# Altium footprint library ThanhNT.PcbLib: 579 footprints (part 16 of 37)
Each footprint in its own frame and in the unit in brackets; x right, y up, seen from the top. Pads: shape width x height; smd on the part's side, far side on the other; paste and mask are expansions set on the pad; w line width, h text height; cw(c..) or ccw(c..) is an arc to the next point about the centre after c.
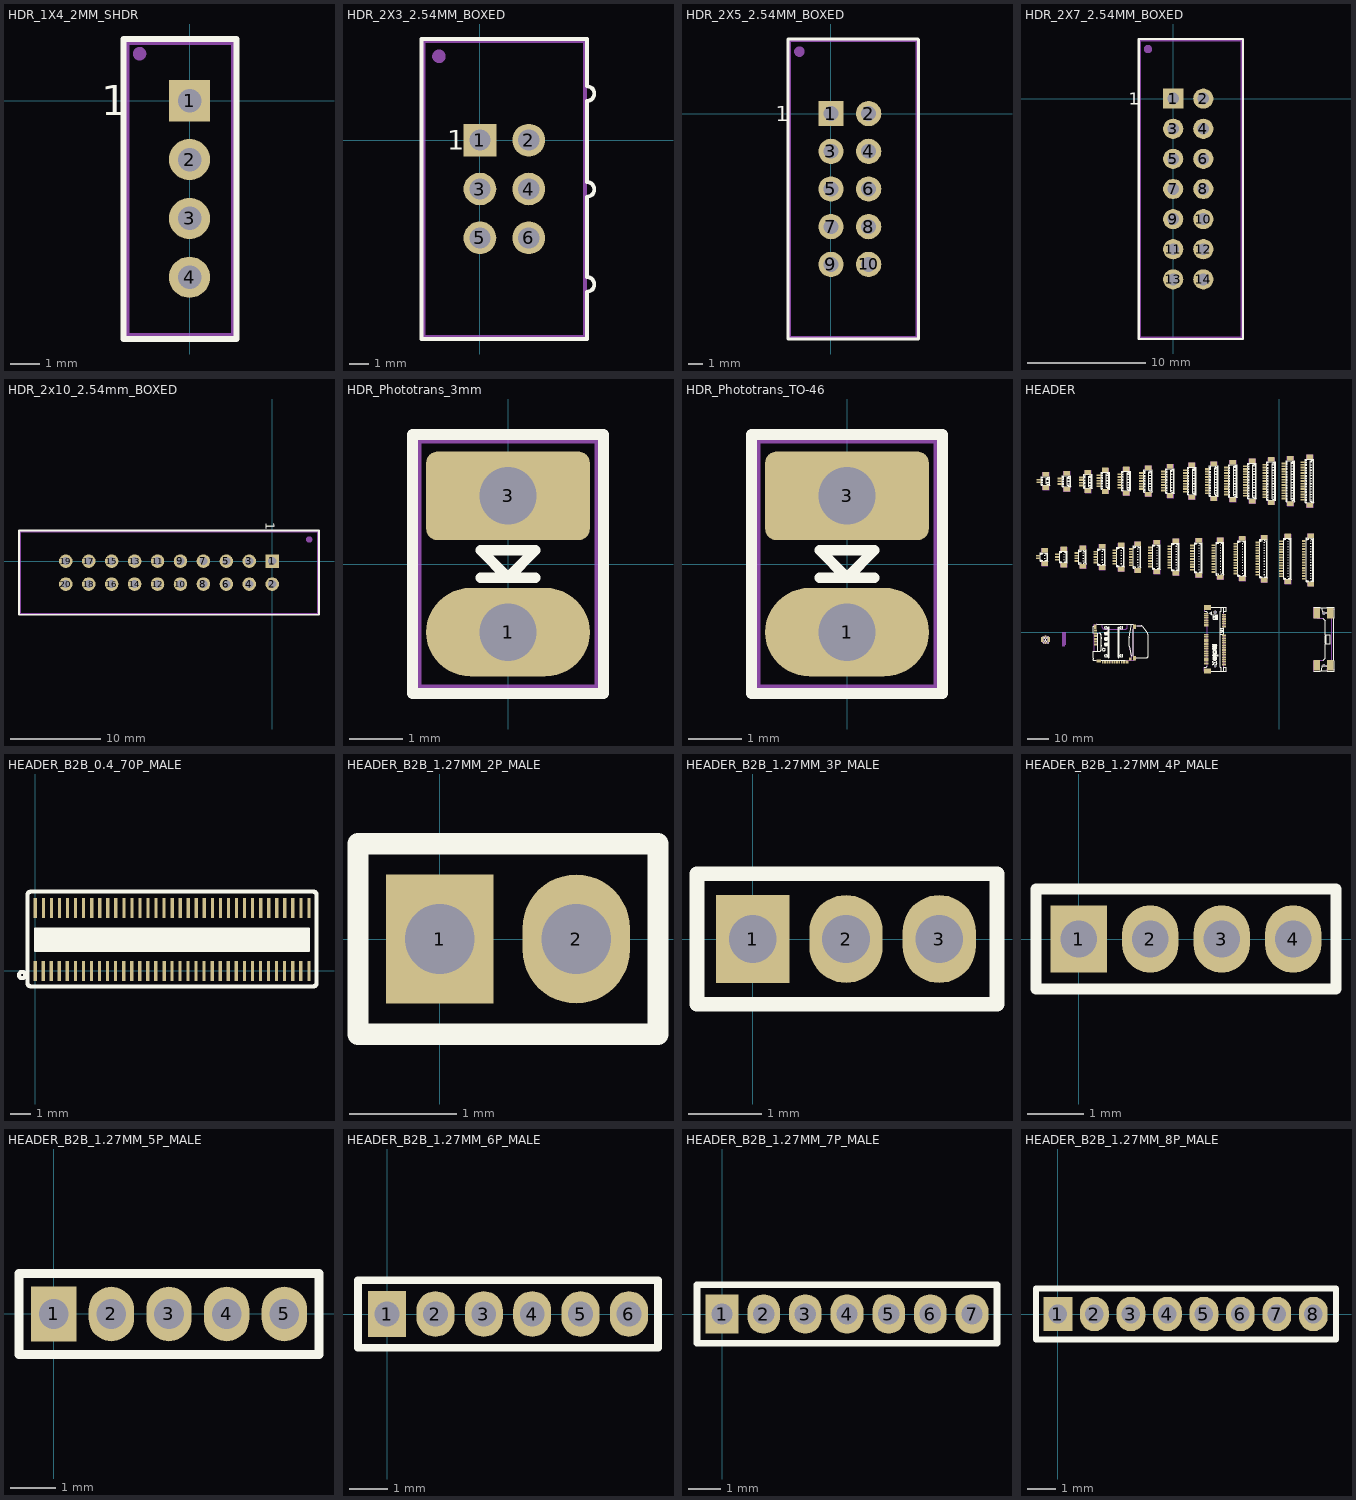
[diagram p15: the footprints below, top view; thin cyan lines are the x and y axes]

## HDR_1X4_2MM_SHDR [mm]
pads (4):
  rect 1.4x1.4 hole 0.8: 1(0,0)
  round 1.4 hole 0.8: 2(0,-2) 3(0,-4) 4(0,-6)
Top Overlay:
  lines w0.2: -2.25,-8.1 1.6,-8.1 1.6,2.1 -2.25,2.1 -2.25,-8.1
  text "1" at -3,-0.5 h1.02
Mechanical 16:
  circle w0.254: c-1.7,1.6 r0.1
  lines w0.2: -2.15,-8 -2.15,2 1.5,2 1.5,-8 -2.15,-8
3D body "532530470.stp": height 5.55, standoff -3.45, extent -2.15,-8 1.5,2

## HDR_2X3_2.54MM_BOXED [mm]
pads (6):
  rect 1.7x1.7 hole 1.1: 1(0,0)
  round 1.7 hole 1.1: 2(2.54,0) 3(0,-2.54) 4(2.54,-2.54) 5(0,-5.08) 6(2.54,-5.08)
Top Overlay:
  lines w0.2: 5.57,-10.34 -3.03,-10.34 -3.03,5.26 5.57,5.26 5.57,2.8 cw(c5.57,2.42) 5.57,2.04 5.57,-2.18 cw(c5.57,-2.56) 5.57,-2.94 5.57,-7.12 cw(c5.57,-7.5) 5.57,-7.88 5.57,-10.3
  text "1" at -1.7,-0.5 h1.02
Mechanical 16:
  circle w0.5: c-2.13,4.36 r0.1
  lines w0.2: -2.93,-10.24 -2.93,5.16 5.47,5.16 5.47,-10.24 -2.93,-10.24
3D body "30306-6002.stp": height 8.89, standoff -3.17, extent -2.931,-10.155 5.883,5.06

## HDR_2X5_2.54MM_BOXED [mm]
pads (10):
  rect 1.7x1.7 hole 1: 1(0,0)
  round 1.7 hole 1: 2(2.54,0) 3(0,-2.54) 4(2.54,-2.54) 5(0,-5.08) 6(2.54,-5.08) 7(0,-7.62) 8(2.54,-7.62) 9(0,-10.16) 10(2.54,-10.16)
Top Overlay:
  lines w0.2: -2.9,-15.19 5.89,-15.19 5.89,5 5.86,5.03 -2.9,5.03 -2.9,-15.19
  text "1" at -3.73,-0.53 h1.02
Mechanical 16:
  circle w0.5: c-2.13,4.18 r0.1
  lines w0.2: -2.8,-15.09 5.79,-15.09 5.79,4.93 -2.8,4.93 -2.8,-15.09
3D body "30310-6002.stp": height 8.89, standoff -3.17, extent -2.906,-15.22 5.908,5.075

## HDR_2X7_2.54MM_BOXED [mm]
pads (14):
  rect 1.7x1.7 hole 1: 1(0,0)
  round 1.7 hole 1: 2(2.54,0) 3(0,-2.54) 4(2.54,-2.54) 5(0,-5.08) 6(2.54,-5.08) 7(0,-7.62) 8(2.54,-7.62) 9(0,-10.16) 10(2.54,-10.16) 11(0,-12.7) 12(2.54,-12.7) 13(0,-15.24) 14(2.54,-15.24)
Top Overlay:
  lines w0.2: -2.9,-20.27 -2.9,5.03 5.89,5.03 5.89,-20.27 -2.9,-20.27
  text "1" at -3.73,-0.53 h1.02
Mechanical 16:
  circle w0.5: c-2.13,4.18 r0.1
  lines w0.2: -2.8,-20.17 -2.8,4.93 5.79,4.93 5.79,-20.17 -2.8,-20.17
3D body "30314-6002.stp": height 8.89, standoff -3.17, extent -2.91,-20.312 5.904,5.062

## HDR_2x10_2.54mm_BOXED [mm]
pads (20):
  rect 1.5x1.5 hole 0.9: 1(0,0)
  round 1.5 hole 0.9: 2(0,-2.54) 3(-2.54,0) 4(-2.54,-2.54) 5(-5.08,0) 6(-5.08,-2.54) 7(-7.62,0) 8(-7.62,-2.54) 9(-10.16,0) 10(-10.16,-2.54) 11(-12.7,0) 12(-12.7,-2.54) 13(-15.24,0) 14(-15.24,-2.54) 15(-17.78,0) 16(-17.78,-2.54) 17(-20.32,0) 18(-20.32,-2.54) 19(-22.86,0) 20(-22.86,-2.54)
Top Overlay:
  lines w0.2: -28.04,-5.942 5.18,-5.942 5.18,3.4 5.178,3.402 -28.04,3.402 -28.04,-5.942
  text "1" at -0.7,4.3 h1.02
Mechanical 16:
  circle w0.5: c4.1,2.4 r0.1
  lines w0.2: -27.94,-5.842 5.08,-5.842 5.08,3.302 -27.94,3.302 -27.94,-5.842
3D body "c-5103308-5-b-3d.stp": height 9.9, standoff -3, extent -27.935,-5.847 5.085,3.297

## HDR_Phototrans_3mm [mil] "LED 3mm dia lens, 0.100\" pitch"
height 525
pads (2):
  oval 120x65 hole 42: 1(0,-50)
  rrect25% 120x65 hole 42: 3(0,50)
Top Overlay:
  lines w7.87: -20,-10 20,-10 ; -70,-95 70,-95 70,95 -70,95 -70,-95 ; -20,10 0,-10 20,10 -20,10
Mechanical 13:
  lines w3: -65,-90 65,-90 65,90 -65,90 -65,-90
3D body "LED_3mm_T1.stp": height 31, standoff -94.49, extent -269.54,-62.87 496.2,62.87

## HDR_Phototrans_TO-46 [mil] "LED TO-46 form, edge straddling"
height 525
pads (2):
  oval 120x65 hole 42: 1(0,-50)
  rrect25% 120x65 hole 42: 3(0,50)
Top Overlay:
  lines w7.87: -20,-10 20,-10 ; -70,-95 70,-95 70,95 -70,95 -70,-95 ; -20,10 0,-10 20,10 -20,10
Mechanical 13:
  lines w3: -65,-90 65,-90 65,90 -65,90 -65,-90
3D body "TO-46 Edge straddling.stp": height 77.29, standoff -150.51, extent -8.99,-119.01 546.86,108.79

## HEADER [mil]
pads (382):
  rect 70.87x31.5 smd: 1(-4411.74,1352.71) 1(-4061.74,1328.11) 1(-3711.74,1303.5) 1(-3361.74,1278.89) 1(-3011.74,1254.29) 1(-2711.74,1229.68) 1(-2361.74,1205.08) 1(-2011.74,1180.47) 1(-1593.51,1144.45) 1(-1199.49,1102.8) 1(-799.49,1078.19) 1(-399.49,1053.58) 1(33.11,1024.49) 1(447.79,981.61) 2(-4411.74,1401.93) 2(-4061.74,1377.32) 2(-3711.74,1352.71) 2(-3361.74,1328.11) 2(-3011.74,1303.5) 2(-2711.74,1278.89) 2(-2361.74,1254.29) 2(-2011.74,1229.68) 2(-1593.51,1193.67) 2(-1199.49,1152.01) 2(-799.49,1127.4) 2(-399.49,1102.8) 2(33.11,1073.7) 2(447.79,1030.82) 3(-4061.74,1426.53) 3(-3711.74,1401.93) 3(-3361.74,1377.32) 3(-3011.74,1352.71) 3(-2711.74,1328.11) 3(-2361.74,1303.5) 3(-2011.74,1278.89) 3(-1593.51,1242.88) 3(-1199.49,1201.22) 3(-799.49,1176.62) 3(-399.49,1152.01) 3(33.11,1122.91) 3(447.79,1080.04) 4(-3711.74,1451.14) 4(-3361.74,1426.53) 4(-3011.74,1401.93) 4(-2711.74,1377.32) 4(-2361.74,1352.71) 4(-2011.74,1328.11) 4(-1593.51,1292.09) 4(-1199.49,1250.43) 4(-799.49,1225.83) 4(-399.49,1201.22) 4(33.11,1172.13) 4(447.79,1129.25) 5(-3361.74,1475.75) 5(-3011.74,1451.14) 5(-2711.74,1426.53) 5(-2361.74,1401.93) 5(-2011.74,1377.32) 5(-1593.51,1341.3) 5(-1199.49,1299.65) 5(-799.49,1275.04) 5(-399.49,1250.43) 5(33.11,1221.34) 5(447.79,1178.46) 6(-3011.74,1500.35) 6(-2711.74,1475.75) 6(-2361.74,1451.14) 6(-2011.74,1426.53) 6(-1593.51,1390.52) 6(-1199.49,1348.86) 6(-799.49,1324.25) 6(-399.49,1299.65) 6(33.11,1270.55) 6(447.79,1227.67) 7(-2711.74,1524.96) 7(-2361.74,1500.35) 7(-2011.74,1475.75) 7(-1593.51,1439.73) 7(-1199.49,1398.07) 7(-799.49,1373.47) 7(-399.49,1348.86) 7(33.11,1319.76) 7(447.79,1276.89) 8(-2361.74,1549.56) 8(-2011.74,1524.96) 8(-1593.51,1488.94) 8(-1199.49,1447.29) 8(-799.49,1422.68) 8(-399.49,1398.07) 8(33.11,1368.98) 8(447.79,1326.1) 9(-2011.74,1574.17) 9(-1593.51,1538.15) 9(-1199.49,1496.5) 9(-799.49,1471.89) 9(-399.49,1447.29) 9(33.11,1418.19) 9(447.79,1375.31) 10(-1593.51,1587.37) 10(-1199.49,1545.71) 10(-799.49,1521.1) 10(-399.49,1496.5) 10(33.11,1467.4) 10(447.79,1424.53) 11(-1199.49,1594.92) 11(-799.49,1570.32) 11(-399.49,1545.71) 11(33.11,1516.61) 11(447.79,1473.74) 12(-799.49,1619.53) 12(-399.49,1594.92) 12(33.11,1565.83) 12(447.79,1522.95) 13(-399.49,1644.14) 13(33.11,1615.04) 13(447.79,1572.16) 14(33.11,1664.25) 14(447.79,1621.38) 15(447.79,1670.59)
  rect 78.74x31.5 smd: 1(-4394.43,2742.39) 1(-4010.43,2713.79) 1(-3620.43,2685.18) 1(-3300.43,2673.57) 1(-2920.68,2643.69) 1(-2520.68,2619.08) 1(-2120.68,2594.48) 1(-1720.68,2569.87) 1(-1320.68,2545.26) 1(-970.68,2520.66) 1(-620.68,2496.05) 1(-270.68,2471.44) 1(79.32,2446.84) 1(429.32,2422.23) 2(-4394.43,2791.61) 2(-4010.43,2763) 2(-3620.43,2734.39) 2(-3300.43,2722.79) 2(-2920.68,2692.9) 2(-2520.68,2668.29) 2(-2120.68,2643.69) 2(-1720.68,2619.08) 2(-1320.68,2594.48) 2(-970.68,2569.87) 2(-620.68,2545.26) 2(-270.68,2520.66) 2(79.32,2496.05) 2(429.32,2471.44) 3(-4010.43,2812.21) 3(-3620.43,2783.61) 3(-3300.43,2772) 3(-2920.68,2742.11) 3(-2520.68,2717.51) 3(-2120.68,2692.9) 3(-1720.68,2668.29) 3(-1320.68,2643.69) 3(-970.68,2619.08) 3(-620.68,2594.48) 3(-270.68,2569.87) 3(79.32,2545.26) 3(429.32,2520.66) 4(-3620.43,2832.82) 4(-3300.43,2821.21) 4(-2920.68,2791.33) 4(-2520.68,2766.72) 4(-2120.68,2742.11) 4(-1720.68,2717.51) 4(-1320.68,2692.9) 4(-970.68,2668.29) 4(-620.68,2643.69) 4(-270.68,2619.08) 4(79.32,2594.48) 4(429.32,2569.87) 5(-3300.43,2870.43) 5(-2920.68,2840.54) 5(-2520.68,2815.93) 5(-2120.68,2791.33) 5(-1720.68,2766.72) 5(-1320.68,2742.11) 5(-970.68,2717.51) 5(-620.68,2692.9) 5(-270.68,2668.29) 5(79.32,2643.69) 5(429.32,2619.08) 6(-2920.68,2889.75) 6(-2520.68,2865.15) 6(-2120.68,2840.54) 6(-1720.68,2815.93) 6(-1320.68,2791.33) 6(-970.68,2766.72) 6(-620.68,2742.11) 6(-270.68,2717.51) 6(79.32,2692.9) 6(429.32,2668.29) 7(-2520.68,2914.36) 7(-2120.68,2889.75) 7(-1720.68,2865.15) 7(-1320.68,2840.54) 7(-970.68,2815.93) 7(-620.68,2791.33) 7(-270.68,2766.72) 7(79.32,2742.11) 7(429.32,2717.51) 8(-2120.68,2938.96) 8(-1720.68,2914.36) 8(-1320.68,2889.75) 8(-970.68,2865.15) 8(-620.68,2840.54) 8(-270.68,2815.93) 8(79.32,2791.33) 8(429.32,2766.72) 9(-1720.68,2963.57) 9(-1320.68,2938.96) 9(-970.68,2914.36) 9(-620.68,2889.75) 9(-270.68,2865.15) 9(79.32,2840.54) 9(429.32,2815.93) 10(-1320.68,2988.18) 10(-970.68,2963.57) 10(-620.68,2938.96) 10(-270.68,2914.36) 10(79.32,2889.75) 10(429.32,2865.15) 11(-970.68,3012.78) 11(-620.68,2988.18) 11(-270.68,2963.57) 11(79.32,2938.96) 11(429.32,2914.36) 12(-620.68,3037.39) 12(-270.68,3012.78) 12(79.32,2988.18) 12(429.32,2963.57) 13(-270.68,3062) 13(79.32,3037.39) 13(429.32,3012.78) 14(79.32,3086.6) 14(429.32,3062) 15(429.32,3111.21)
  rect 39.37x39.37 smd: 1(-4273.15,-191.15) S@1(-4273.15,-73.03)
  rect 78.74x23.62 smd: 1(-1334.61,339.35) 2(-1011.77,323.6) 3(-1334.61,307.85) 4(-1011.77,292.11) 5(-1334.61,276.36) 6(-1011.77,260.61) 7(-1334.61,244.86) 8(-1011.77,229.11) 9(-1334.61,213.37) 10(-1011.77,197.62) 11(-1334.61,181.87) 12(-1011.77,166.12) 13(-1334.61,150.37) 14(-1011.77,134.63) 15(-1334.61,118.88) 16(-1011.77,103.13) 17(-1334.61,-38.6) 18(-1011.77,-54.35) 19(-1334.61,-70.1) 20(-1011.77,-85.85) 21(-1334.61,-101.59) 22(-1011.77,-117.34) 23(-1334.61,-133.09) 24(-1011.77,-148.84) 25(-1334.61,-164.59) 26(-1011.77,-180.33) 27(-1334.61,-196.08) 28(-1011.77,-211.83) 29(-1334.61,-227.58) 30(-1011.77,-243.33) 31(-1334.61,-259.07) 32(-1011.77,-274.82) 33(-1334.61,-290.57) 34(-1011.77,-306.32) 35(-1334.61,-322.07) 36(-1011.77,-337.81) 37(-1334.61,-353.56) 38(-1011.77,-369.31) 39(-1334.61,-385.06) 40(-1011.77,-400.81) 41(-1334.61,-416.55) 42(-1011.77,-432.3) 43(-1334.61,-448.05) 44(-1011.77,-463.8) 45(-1334.61,-479.55) 46(-1011.77,-495.29) 47(-1334.61,-511.04) 48(-1011.77,-526.79) 49(-1334.61,-542.54) 50(-1011.77,-558.29) 51(-1334.61,-574.03) 52(-1011.77,-589.78)
  round 43.31 hole 43.31: 1(-1173.19,-617.34) 1(811.06,-601.59)
  round 62.99 hole 62.99: 1(-1173.19,366.91) 1(811.06,351.16)
  rect 53.15x78.74 smd: G1(-2645.61,105.31) G2(-3364.61,105.31)
  rect 57.09x78.74 smd: G3(-2647.58,-475.39)
  rect 78.74x57.09 smd: G4(-3298.66,-521.65)
  rect 125.98x90.55 smd: M1(-1310.99,-701.99) M2(-1310.99,451.56)
  rect 118.11x188.98 smd: M3(687.05,351.16) M4(935.08,351.16) M5(687.05,-601.59) M6(935.08,-601.59)
  rect 118.11x82.68 smd: S1(-4288.7,1254.29) S1(-4271.39,2643.97) S1(-3938.7,1229.68) S1(-3887.39,2615.36) S1(-3588.7,1205.08) S1(-3497.39,2586.76) S1(-3238.7,1180.47) S1(-3177.39,2575.15) S1(-2888.7,1155.86) S1(-2797.64,2545.26) S1(-2588.7,1131.26) S1(-2397.64,2520.66) S1(-2238.7,1106.65) S1(-1997.64,2496.05) S1(-1888.7,1082.04) S1(-1597.64,2471.44) S1(-1470.47,1046.03) S1(-1197.64,2446.84) S1(-1076.45,1004.37) S1(-847.64,2422.23) S1(-676.45,979.77) S1(-497.64,2397.63) S1(-276.45,955.16) S1(-147.64,2373.02) S1(156.15,926.06) S1(202.36,2348.41) S1(552.36,2323.81) S1(570.83,883.19) S2(-4288.7,1500.35) S2(-4271.39,2890.03) S2(-3938.7,1524.96) S2(-3887.39,2910.64) S2(-3588.7,1549.56) S2(-3497.39,2931.24) S2(-3238.7,1574.17) S2(-3177.39,2968.85) S2(-2888.7,1598.78) S2(-2797.64,2988.18) S2(-2588.7,1623.38) S2(-2397.64,3012.78) S2(-2238.7,1647.99) S2(-1997.64,3037.39) S2(-1888.7,1672.6) S2(-1597.64,3062) S2(-1470.47,1685.79) S2(-1197.64,3086.6) S2(-1076.45,1693.35) S2(-847.64,3111.21) S2(-676.45,1717.95) S2(-497.64,3135.81) S2(-276.45,1742.56) S2(-147.64,3160.42) S2(156.15,1762.68) S2(202.36,3185.03) S2(552.36,3209.63) S2(570.83,1769.01)
  rect 31.5x49.21 smd: S1(-3227.3,-543.3) S5(-2837.54,-543.3) T1(-2880.85,-543.3) T2(-2924.15,-543.3) T3(-2967.46,-543.3) T4(-3010.77,-543.3) T5(-3054.07,-543.3) T6(-3097.38,-543.3) T7(-3140.69,-543.3) T8(-3183.99,-543.3)
  rect 55.12x38.58 smd: S2(-3355.75,-218.5) S3(-3355.75,-118.5) S4(-3355.75,-18.5) S6(-3355.75,-168.5) S7(-3355.75,-68.5) S8(-3355.75,31.5)
  rect 41.34x86.61 smd: S@2(-4331.22,-132.09) S@3(-4215.08,-132.09)
  rect 47.24x55.12 smd: ST1(-2784.39,-540.36) ST2(-2725.33,-485.24)
Top Overlay:
  drawing of 1594 lines, arcs and shapes, not listed
Top Paste:
  region: -1372.01,349.69 -1372.01,329.02 -1297.21,329.02 -1297.21,349.69
  region: -1372.01,318.19 -1372.01,297.52 -1297.21,297.52 -1297.21,318.19
  region: -1372.01,286.69 -1372.01,266.02 -1297.21,266.02 -1297.21,286.69
  region: -1372.01,255.2 -1372.01,234.53 -1297.21,234.53 -1297.21,255.2
  region: -1372.01,223.7 -1372.01,203.03 -1297.21,203.03 -1297.21,223.7
  region: -1372.01,192.21 -1372.01,171.54 -1297.21,171.54 -1297.21,192.21
  region: -1372.01,160.71 -1372.01,140.04 -1297.21,140.04 -1297.21,160.71
  region: -1372.01,129.21 -1372.01,108.54 -1297.21,108.54 -1297.21,129.21
  region: -1372.01,-28.27 -1372.01,-48.94 -1297.21,-48.94 -1297.21,-28.27
  region: -1372.01,-59.76 -1372.01,-80.43 -1297.21,-80.43 -1297.21,-59.76
  region: -1372.01,-91.26 -1372.01,-111.93 -1297.21,-111.93 -1297.21,-91.26
  region: -1372.01,-122.76 -1372.01,-143.42 -1297.21,-143.42 -1297.21,-122.76
  region: -1372.01,-154.25 -1372.01,-174.92 -1297.21,-174.92 -1297.21,-154.25
  region: -1372.01,-185.75 -1372.01,-206.42 -1297.21,-206.42 -1297.21,-185.75
  region: -1372.01,-217.24 -1372.01,-237.91 -1297.21,-237.91 -1297.21,-217.24
  region: -1372.01,-248.74 -1372.01,-269.41 -1297.21,-269.41 -1297.21,-248.74
  region: -1372.01,-280.24 -1372.01,-300.91 -1297.21,-300.91 -1297.21,-280.24
  region: -1372.01,-311.73 -1372.01,-332.4 -1297.21,-332.4 -1297.21,-311.73
  region: -1372.01,-343.23 -1372.01,-363.9 -1297.21,-363.9 -1297.21,-343.23
  region: -1372.01,-374.72 -1372.01,-395.39 -1297.21,-395.39 -1297.21,-374.72
  region: -1372.01,-406.22 -1372.01,-426.89 -1297.21,-426.89 -1297.21,-406.22
  region: -1372.01,-437.72 -1372.01,-458.39 -1297.21,-458.39 -1297.21,-437.72
  region: -1372.01,-469.21 -1372.01,-489.88 -1297.21,-489.88 -1297.21,-469.21
  region: -1372.01,-500.71 -1372.01,-521.38 -1297.21,-521.38 -1297.21,-500.71
  region: -1372.01,-532.2 -1372.01,-552.87 -1297.21,-552.87 -1297.21,-532.2
  region: -1372.01,-563.7 -1372.01,-584.37 -1297.21,-584.37 -1297.21,-563.7
  region: -1370.04,-660.65 -1370.04,-743.33 -1251.93,-743.33 -1251.93,-660.65
  region: -1369.55,492.89 -1369.55,410.22 -1251.44,410.22 -1251.44,492.89
  region: -1049.17,333.94 -1049.17,313.27 -974.37,313.27 -974.37,333.94
  region: -1049.17,302.44 -1049.17,281.77 -974.37,281.77 -974.37,302.44
  region: -1049.17,270.95 -1049.17,250.28 -974.37,250.28 -974.37,270.95
  region: -1049.17,239.45 -1049.17,218.78 -974.37,218.78 -974.37,239.45
  region: -1049.17,207.95 -1049.17,187.28 -974.37,187.28 -974.37,207.95
  region: -1049.17,176.46 -1049.17,155.79 -974.37,155.79 -974.37,176.46
  region: -1049.17,144.96 -1049.17,124.29 -974.37,124.29 -974.37,144.96
  region: -1049.17,113.47 -1049.17,92.8 -974.37,92.8 -974.37,113.47
  region: -1049.17,-44.02 -1049.17,-64.68 -974.37,-64.68 -974.37,-44.02
  region: -1049.17,-75.51 -1049.17,-96.18 -974.37,-96.18 -974.37,-75.51
  region: -1049.17,-107.01 -1049.17,-127.68 -974.37,-127.68 -974.37,-107.01
  region: -1049.17,-138.5 -1049.17,-159.17 -974.37,-159.17 -974.37,-138.5
  region: -1049.17,-170 -1049.17,-190.67 -974.37,-190.67 -974.37,-170
  region: -1049.17,-201.5 -1049.17,-222.16 -974.37,-222.16 -974.37,-201.5
  region: -1049.17,-232.99 -1049.17,-253.66 -974.37,-253.66 -974.37,-232.99
  region: -1049.17,-264.49 -1049.17,-285.16 -974.37,-285.16 -974.37,-264.49
  region: -1049.17,-295.98 -1049.17,-316.65 -974.37,-316.65 -974.37,-295.98
  region: -1049.17,-327.48 -1049.17,-348.15 -974.37,-348.15 -974.37,-327.48
  region: -1049.17,-358.98 -1049.17,-379.65 -974.37,-379.65 -974.37,-358.98
  region: -1049.17,-390.47 -1049.17,-411.14 -974.37,-411.14 -974.37,-390.47
  region: -1049.17,-421.97 -1049.17,-442.64 -974.37,-442.64 -974.37,-421.97
  region: -1049.17,-453.46 -1049.17,-474.13 -974.37,-474.13 -974.37,-453.46
  region: -1049.17,-484.96 -1049.17,-505.63 -974.37,-505.63 -974.37,-484.96
  region: -1049.17,-516.46 -1049.17,-537.13 -974.37,-537.13 -974.37,-516.46
  region: -1049.17,-547.95 -1049.17,-568.62 -974.37,-568.62 -974.37,-547.95
  region: -1049.17,-579.45 -1049.17,-600.12 -974.37,-600.12 -974.37,-579.45
  region: 883.4,440.24 883.4,263.07 987.74,263.07 987.74,440.24
  region: 634.88,440.24 634.88,263.07 739.21,263.07 739.21,440.24
  region: 881.93,-513.01 881.93,-690.18 987.74,-690.18 987.74,-513.01
  region: 635.37,-512.52 635.37,-689.68 739.7,-689.68 739.7,-512.52
Top Solder:
  region: -1376.93,353.13 -1376.93,326.06 -1292.28,326.06 -1292.28,353.13
  region: -1376.93,321.63 -1376.93,294.57 -1292.28,294.57 -1292.28,321.63
  region: -1376.93,290.14 -1376.93,263.07 -1292.28,263.07 -1292.28,290.14
  region: -1376.93,258.64 -1376.93,231.58 -1292.28,231.58 -1292.28,258.64
  region: -1376.93,227.15 -1376.93,200.08 -1292.28,200.08 -1292.28,227.15
  region: -1376.93,195.65 -1376.93,168.58 -1292.28,168.58 -1292.28,195.65
  region: -1376.93,164.15 -1376.93,137.09 -1292.28,137.09 -1292.28,164.15
  region: -1376.93,132.66 -1376.93,105.59 -1292.28,105.59 -1292.28,132.66
  region: -1376.93,-24.82 -1376.93,-51.89 -1292.28,-51.89 -1292.28,-24.82
  region: -1376.93,-56.32 -1376.93,-83.39 -1292.28,-83.39 -1292.28,-56.32
  region: -1376.93,-87.81 -1376.93,-114.88 -1292.28,-114.88 -1292.28,-87.81
  region: -1376.93,-119.31 -1376.93,-146.38 -1292.28,-146.38 -1292.28,-119.31
  region: -1376.93,-150.81 -1376.93,-177.87 -1292.28,-177.87 -1292.28,-150.81
  region: -1376.93,-182.3 -1376.93,-209.37 -1292.28,-209.37 -1292.28,-182.3
  region: -1376.93,-213.8 -1376.93,-240.87 -1292.28,-240.87 -1292.28,-213.8
  region: -1376.93,-245.29 -1376.93,-272.36 -1292.28,-272.36 -1292.28,-245.29
  region: -1376.93,-276.79 -1376.93,-303.86 -1292.28,-303.86 -1292.28,-276.79
  region: -1376.93,-308.29 -1376.93,-335.35 -1292.28,-335.35 -1292.28,-308.29
  region: -1376.93,-339.78 -1376.93,-366.85 -1292.28,-366.85 -1292.28,-339.78
  region: -1376.93,-371.28 -1376.93,-398.35 -1292.28,-398.35 -1292.28,-371.28
  region: -1376.93,-402.78 -1376.93,-429.84 -1292.28,-429.84 -1292.28,-402.78
  region: -1376.93,-434.27 -1376.93,-461.34 -1292.28,-461.34 -1292.28,-434.27
  region: -1376.93,-465.77 -1376.93,-492.83 -1292.28,-492.83 -1292.28,-465.77
  region: -1376.93,-497.26 -1376.93,-524.33 -1292.28,-524.33 -1292.28,-497.26
  region: -1376.93,-528.76 -1376.93,-555.83 -1292.28,-555.83 -1292.28,-528.76
  region: -1376.93,-560.26 -1376.93,-587.32 -1292.28,-587.32 -1292.28,-560.26
  region: -1377.91,-652.78 -1377.91,-751.2 -1244.55,-751.2 -1244.55,-652.78
  region: -1377.42,500.77 -1377.42,402.34 -1244.06,402.34 -1244.06,500.77
  region: -1054.1,337.38 -1054.1,310.32 -969.45,310.32 -969.45,337.38
  region: -1054.1,305.89 -1054.1,278.82 -969.45,278.82 -969.45,305.89
  region: -1054.1,274.39 -1054.1,247.32 -969.45,247.32 -969.45,274.39
  region: -1054.1,242.89 -1054.1,215.83 -969.45,215.83 -969.45,242.89
  region: -1054.1,211.4 -1054.1,184.33 -969.45,184.33 -969.45,211.4
  region: -1054.1,179.9 -1054.1,152.84 -969.45,152.84 -969.45,179.9
  region: -1054.1,148.41 -1054.1,121.34 -969.45,121.34 -969.45,148.41
  region: -1054.1,116.91 -1054.1,89.84 -969.45,89.84 -969.45,116.91
  region: -1054.1,-40.57 -1054.1,-67.64 -969.45,-67.64 -969.45,-40.57
  region: -1054.1,-72.07 -1054.1,-99.13 -969.45,-99.13 -969.45,-72.07
  region: -1054.1,-103.56 -1054.1,-130.63 -969.45,-130.63 -969.45,-103.56
  region: -1054.1,-135.06 -1054.1,-162.13 -969.45,-162.13 -969.45,-135.06
  region: -1054.1,-166.55 -1054.1,-193.62 -969.45,-193.62 -969.45,-166.55
  region: -1054.1,-198.05 -1054.1,-225.12 -969.45,-225.12 -969.45,-198.05
  region: -1054.1,-229.55 -1054.1,-256.61 -969.45,-256.61 -969.45,-229.55
  region: -1054.1,-261.04 -1054.1,-288.11 -969.45,-288.11 -969.45,-261.04
  region: -1054.1,-292.54 -1054.1,-319.61 -969.45,-319.61 -969.45,-292.54
  region: -1054.1,-324.03 -1054.1,-351.1 -969.45,-351.1 -969.45,-324.03
  region: -1054.1,-355.53 -1054.1,-382.6 -969.45,-382.6 -969.45,-355.53
  region: -1054.1,-387.03 -1054.1,-414.09 -969.45,-414.09 -969.45,-387.03
  region: -1054.1,-418.52 -1054.1,-445.59 -969.45,-445.59 -969.45,-418.52
  region: -1054.1,-450.02 -1054.1,-477.09 -969.45,-477.09 -969.45,-450.02
  region: -1054.1,-481.52 -1054.1,-508.58 -969.45,-508.58 -969.45,-481.52
  region: -1054.1,-513.01 -1054.1,-540.08 -969.45,-540.08 -969.45,-513.01
  region: -1054.1,-544.51 -1054.1,-571.57 -969.45,-571.57 -969.45,-544.51
  region: -1054.1,-576 -1054.1,-603.07 -969.45,-603.07 -969.45,-576
  region: 869.13,453.03 869.13,250.28 1000.53,250.28 1000.53,453.03
  region: 620.61,453.03 620.61,250.28 752.01,250.28 752.01,453.03
  region: 869.13,-500.22 869.13,-702.97 1000.53,-702.97 1000.53,-500.22
  region: 621.1,-499.72 621.1,-702.48 752.5,-702.48 752.5,-499.72
Mechanical 16:
  drawing of 335 lines, arcs and shapes, not listed
  text "1" at 536.38,907.79 h117.8
  text "1" at 121.7,950.67 h117.8
  text "1" at -310.9,979.77 h117.8
  text "1" at -710.9,1004.37 h117.8
  text "1" at -1110.9,1028.98 h117.8
  text "1" at -1504.92,1070.63 h117.8
  text "1" at -1923.15,1106.65 h117.8
  text "1" at -2273.15,1131.26 h117.8
  text "1" at -2623.15,1155.86 h117.8
  text "1" at -2923.15,1180.47 h117.8
  text "1" at -3273.15,1205.08 h117.8
  text "1" at -3623.15,1229.68 h117.8
  text "1" at -3973.15,1254.29 h117.8
  text "1" at -4323.15,1278.89 h117.8
  text "1" at 517.91,2343.49 h117.8
  text "1" at 167.91,2373.02 h117.8
  text "1" at -182.09,2392.7 h117.8
  text "1" at -532.09,2422.23 h117.8
  text "1" at -882.09,2441.92 h117.8
  text "1" at -1232.09,2471.44 h117.8
  text "1" at -1632.09,2496.05 h117.8
  text "1" at -2032.09,2520.66 h117.8
  text "1" at -2432.09,2540.34 h117.8
  text "1" at -2832.09,2569.87 h117.8
  text "1" at -4305.84,2668.57 h117.8
  text "1" at -3921.84,2639.97 h117.8
  text "1" at -3531.84,2611.36 h117.8
  text "1" at -3211.84,2599.76 h117.8
Mechanical 27:
  region: -3972.84,5.2 -3972.84,-234.47 -3897.05,-234.47 -3897.05,5.2
  region: -3972.84,-234.47 -3972.84,-256.12 -3913.78,-256.12 -3913.78,-234.47
3D body "K3D-MM60-EZH059-B5-R2 JAE Connector Division Proprietary.STEP": height 263.78, standoff -35.43, extent 656.48,-696.86 967.5,444.87
3D body "K3D-MM60-52B1-E1-R2 JAE Connector Division Proprietary.STEP": height 234.25, standoff -29.53, extent -1368.85,-708.64 -975.15,460.65

## HEADER_B2B_0.4_70P_MALE [mm] "Board to Board Connector (AXK870145W)"
pads (70):
  rect 0.16x1 smd: 1(0,0) 2(0.39,0) 3(0.79,0) 4(1.19,0) 5(1.59,0) 6(1.99,0) 7(2.39,0) 8(2.79,0) 9(3.19,0) 10(3.59,0) 11(3.99,0) 12(4.39,0) 13(4.79,0) 13(5.19,0) 15(5.59,0) 16(5.99,0) 17(6.41,0) 18(6.79,0) 19(7.19,0) 20(7.59,0) 21(7.99,0) 22(8.39,0) 23(8.79,0) 24(9.19,0) 25(9.59,0) 26(9.99,0) 27(10.39,0) 28(10.79,0) 29(11.19,0) 30(11.59,0) 31(11.99,0) 32(12.39,0) 33(12.79,0) 34(13.19,0) 35(13.6,0) 36(13.6,3.12) 37(13.2,3.12) 38(12.8,3.12) 39(12.4,3.12) 40(12,3.12) 41(11.6,3.12) 42(11.2,3.12) 43(10.8,3.12) 44(10.4,3.12) 45(10,3.12) 46(9.6,3.12) 47(9.2,3.12) 48(8.8,3.12) 49(8.4,3.12) 50(8,3.12) 51(7.6,3.12) 52(7.2,3.12) 53(6.8,3.12) 54(6.4,3.12) 55(6,3.12) 56(5.6,3.12) 57(5.2,3.12) 58(4.8,3.12) 59(4.4,3.12) 60(4,3.12) 61(3.6,3.12) 62(3.2,3.12) 63(2.8,3.12) 64(2.4,3.12) 65(2,3.12) 66(1.6,3.12) 67(1.2,3.12) 68(0.8,3.12) 69(0.4,3.12) 70(0,3.12)
Top Overlay:
  circle w0.2: c-0.657,-0.203 r0.156
  rectangle: 0,1 13.6,2.1
  lines w0.127: 0,1 13.6,1 13.6,2.1 0,2.1 0,1
  lines w0.2: -0.381,-0.635 ccw(c-0.254,-0.635) -0.254,-0.762 13.843,-0.762 ccw(c13.843,-0.635) 13.97,-0.635 13.97,3.81 ccw(c13.843,3.81) 13.843,3.937 13.818,3.937 -0.254,3.937 ccw(c-0.254,3.81) -0.381,3.81 -0.381,-0.635

## HEADER_B2B_1.27MM_2P_MALE [mm]
pads (2):
  rect 1x1.2 hole 0.65: 1(0,0)
  oval 1x1.2 hole 0.65: 2(1.27,0)
Top Overlay:
  lines w0.2: -0.762,-0.889 -0.762,0.889 2.032,0.889 2.032,-0.889 -0.762,-0.889

## HEADER_B2B_1.27MM_3P_MALE [mm]
pads (3):
  rect 1x1.2 hole 0.65: 1(0,0)
  oval 1x1.2 hole 0.65: 2(1.27,0) 3(2.54,0)
Top Overlay:
  lines w0.2: -0.762,-0.889 -0.762,0.889 3.327,0.889 3.327,-0.889 -0.762,-0.889

## HEADER_B2B_1.27MM_4P_MALE [mm]
pads (4):
  rect 1x1.2 hole 0.65: 1(0,0)
  oval 1x1.2 hole 0.65: 2(1.27,0) 3(2.54,0) 4(3.81,0)
Top Overlay:
  lines w0.2: -0.762,-0.889 4.572,-0.889 4.572,0.889 -0.762,0.889 -0.762,-0.889

## HEADER_B2B_1.27MM_5P_MALE [mm]
pads (5):
  rect 1x1.2 hole 0.65: 1(0,0)
  oval 1x1.2 hole 0.65: 2(1.27,0) 3(2.54,0) 4(3.81,0) 5(5.08,0)
Top Overlay:
  lines w0.2: -0.762,-0.889 5.842,-0.889 5.842,0.889 -0.762,0.889 -0.762,-0.889

## HEADER_B2B_1.27MM_6P_MALE [mm]
pads (6):
  rect 1x1.2 hole 0.65: 1(0,0)
  oval 1x1.2 hole 0.65: 2(1.27,0) 3(2.54,0) 4(3.81,0) 5(5.08,0) 6(6.35,0)
Top Overlay:
  lines w0.2: -0.762,-0.889 -0.762,0.889 7.112,0.889 7.112,-0.889 -0.762,-0.889

## HEADER_B2B_1.27MM_7P_MALE [mm]
pads (7):
  rect 1x1.2 hole 0.65: 1(0,0)
  oval 1x1.2 hole 0.65: 2(1.27,0) 3(2.54,0) 4(3.81,0) 5(5.08,0) 6(6.35,0) 7(7.62,0)
Top Overlay:
  lines w0.2: -0.762,-0.889 8.382,-0.889 8.382,0.889 -0.762,0.889 -0.762,-0.889

## HEADER_B2B_1.27MM_8P_MALE [mm]
pads (8):
  rect 1x1.2 hole 0.65: 1(0,0)
  oval 1x1.2 hole 0.65: 2(1.27,0) 3(2.54,0) 4(3.81,0) 5(5.08,0) 6(6.35,0) 7(7.62,0) 8(8.89,0)
Top Overlay:
  lines w0.2: -0.762,-0.889 -0.762,0.889 9.677,0.889 9.677,-0.889 -0.762,-0.889